# Altium footprint library UltraZOhm_CarrierBoard.PcbLib: 71 footprints (part 1 of 5)
Each footprint in its own frame and in the unit in brackets; x right, y up, seen from the top. Pads: shape width x height; smd on the part's side, far side on the other; paste and mask are expansions set on the pad; w line width, h text height; cw(c..) or ccw(c..) is an arc to the next point about the centre after c.
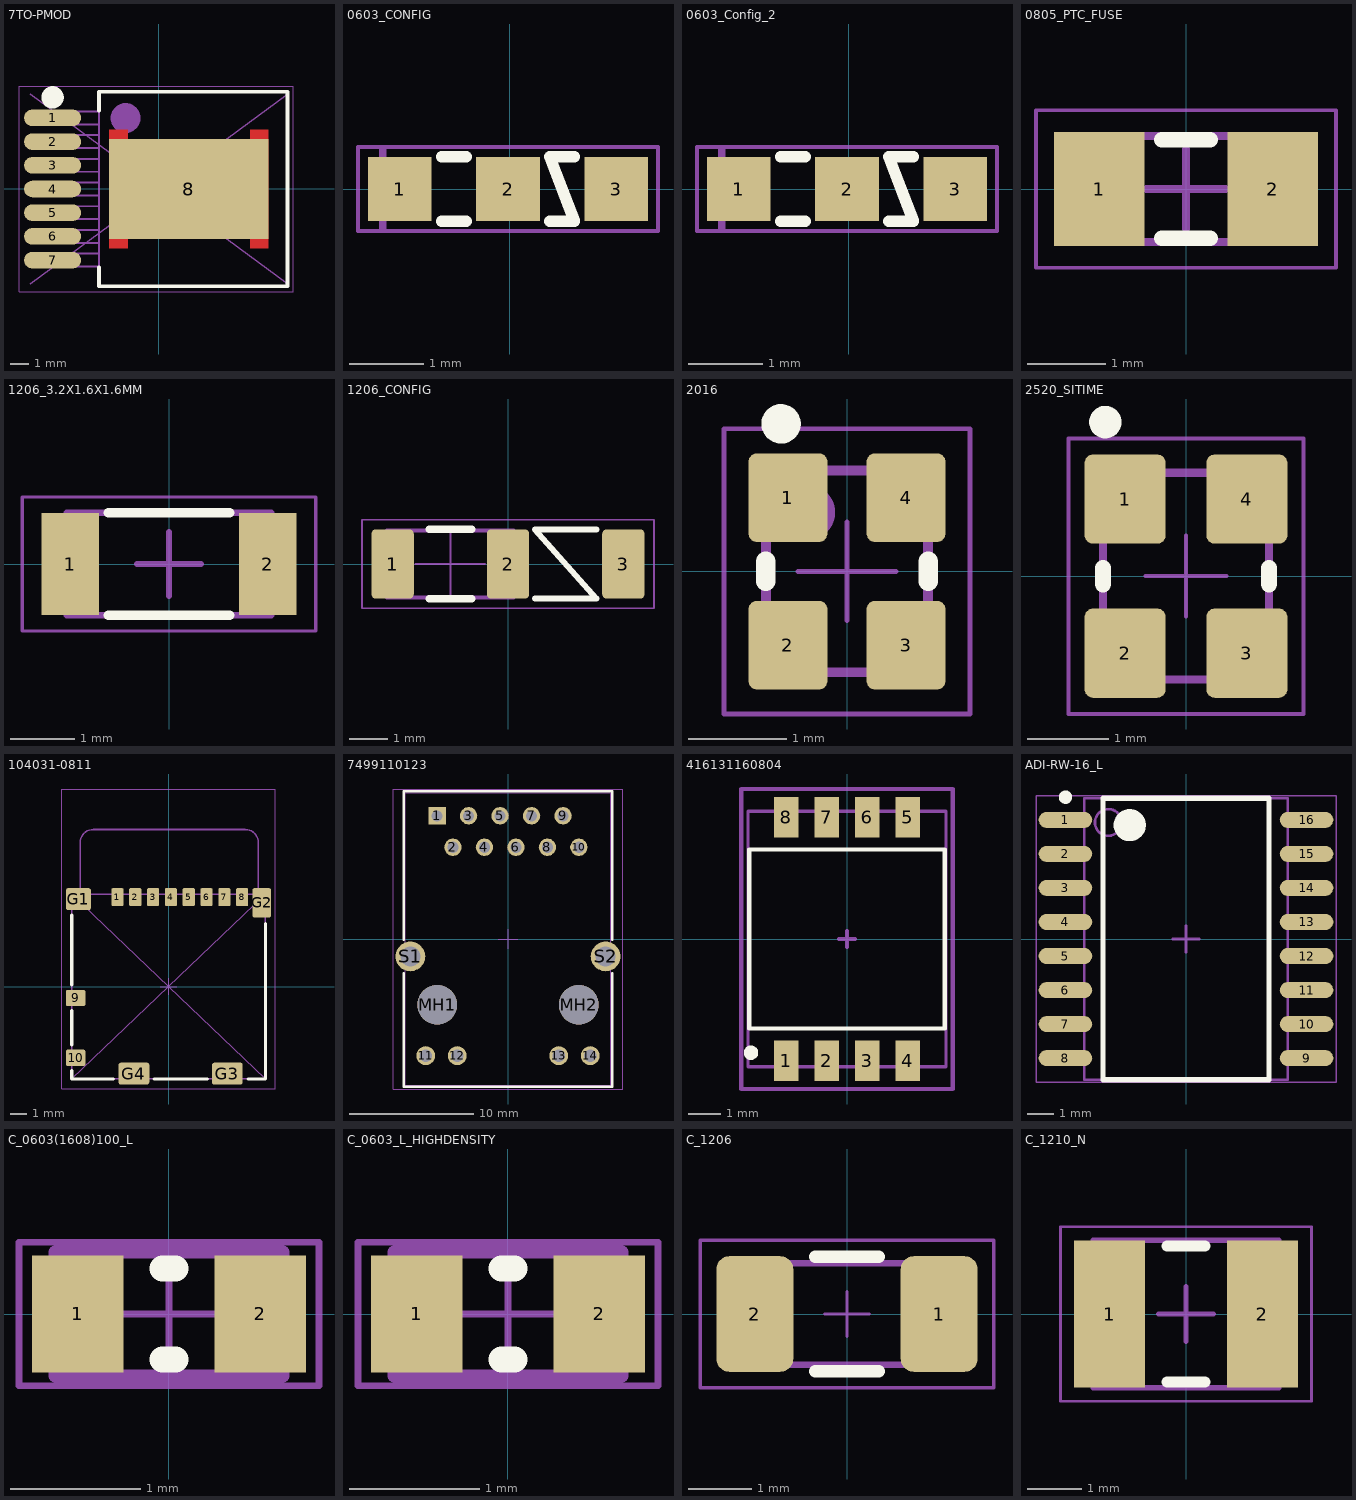
[diagram p0: the footprints below, top view; thin cyan lines are the x and y axes]

## 7TO-PMOD [mm]
pads (8):
  oval 3.06x0.89 smd: 1(-5.7,3.81) 2(-5.7,2.54) 3(-5.7,1.27) 4(-5.7,0) 5(-5.7,-1.27) 6(-5.7,-2.54) 7(-5.7,-3.81)
  rect 8.54x5.35 smd: 8(1.605,0)
Top Layer:
  region: 5.875,-3.2 5.875,3.2 4.875,3.2 4.875,-3.2
  region: -2.665,3.2 -2.665,-3.2 -1.665,-3.2 -1.665,3.2
Top Overlay:
  circle w0.6: c-5.7,4.91 r0.3
  lines w0.2: -3.215,-4.205 -3.215,-5.205 6.885,-5.205 6.885,5.205 -3.215,5.205 -3.215,4.205
Mechanical 5:
  circle w0.8: c-1.79,3.8 r0.4
  lines w0.1: -6.89,-4.155 -3.215,-4.155 ; -6.89,-3.465 -3.215,-3.465 ; -6.89,-2.885 -3.215,-2.885 ; -6.89,-2.195 -3.215,-2.195 ; -6.89,-1.615 -3.215,-1.615 ; -6.89,-0.925 -3.215,-0.925 ; -6.89,-0.345 -3.215,-0.345 ; -6.89,0.345 -3.215,0.345 ; -6.89,0.925 -3.215,0.925 ; -6.89,1.615 -3.215,1.615 ; -6.89,2.195 -3.215,2.195 ; -6.89,2.885 -3.215,2.885 ; -6.89,3.465 -3.215,3.465 ; -6.89,4.155 -3.215,4.155 ; -6.885,-4.155 -6.885,-3.465 ; -6.885,-2.885 -6.885,-2.195 ; -6.885,-1.615 -6.885,-0.925 ; -6.885,-0.345 -6.885,0.345 ; -6.885,0.925 -6.885,1.615 ; -6.885,2.195 -6.885,2.885 ; -6.885,3.465 -6.885,4.155 ; -4.79,-4.155 -4.79,-3.465 ; -4.79,-2.885 -4.79,-2.195 ; -4.79,-1.615 -4.79,-0.925 ; -4.79,-0.345 -4.79,0.345 ; -4.79,0.93 -4.79,1.615 ; -4.79,2.205 -4.79,2.885 ; -4.79,3.465 -4.79,4.155 ; -3.215,-5.205 -3.215,5.205 6.885,5.205 6.885,-5.205 -3.215,-5.205
  text ".Designator" at 1.437,1.658 h1.52
Mechanical 15:
  lines w0.05: -0.5,0 0.5,0 ; 0,-0.5 0,0.5 ; -7.5,-5.5 -7.5,5.5 7.2,5.5 7.2,-5.5 -7.5,-5.5
  lines w0.1: -6.885,-5.08 6.885,5.08 ; -6.885,5.08 6.885,-5.08
3D body: height 4.8, standoff 0, extent -2.138,2.275 -0.142,4.267
3D body "NDW0007A.stp": height 4.77, standoff 0, extent -6.885,-5.08 6.885,5.08

## 0603_CONFIG [mm]
pads (3):
  rect 0.85x0.85 smd: 1(-1.475,0) 2(-0.025,0) 3(1.425,0)
Top Overlay:
  lines w0.152: -0.914,-0.432 -0.584,-0.432 ; -0.914,0.432 -0.584,0.432 ; 0.533,-0.432 0.864,-0.432 0.533,0.432 0.864,0.432
Mechanical 5:
  lines w0.054: -2.032,-0.559 -2.032,0.559 1.981,0.559 1.981,-0.559 -2.032,-0.559
  lines w0.102: -1.7,-0.525 -1.7,0.525
  text ".Designator" at 1.795,0.417 h0.76
3D body: height 2.8, standoff -2.8, extent -1.537,-1.143 -1.537,-1.143
3D body "User Library-RESC1608X___.STEP": height 0.3, standoff 0, extent -1.55,-0.4 0.05,0.4

## 0603_Config_2 [mm]
pads (3):
  rect 0.85x0.85 smd: 1(-1.475,0) 2(-0.025,0) 3(1.425,0)
Top Overlay:
  lines w0.152: -0.914,-0.432 -0.584,-0.432 ; -0.914,0.432 -0.584,0.432 ; 0.533,-0.432 0.864,-0.432 0.533,0.432 0.864,0.432
Mechanical 5:
  lines w0.054: -2.032,-0.559 -2.032,0.559 1.981,0.559 1.981,-0.559 -2.032,-0.559
  lines w0.102: -1.7,-0.525 -1.7,0.525
  text ".Designator" at -1.4,-0.4 h0.76
3D body: height 2.8, standoff -2.8, extent -1.537,-1.143 -1.537,-1.143
3D body "User Library-RESC1608X___.STEP": height 0.3, standoff 0, extent -1.55,-0.4 0.05,0.4

## 0805_PTC_FUSE [mm]
pads (2):
  rect 1.15x1.45 smd: 1(-1.1,0) 2(1.1,0)
Top Overlay:
  lines w0.2: -0.304,-0.625 0.304,-0.625 ; -0.304,0.625 0.304,0.625
Mechanical 5:
  lines w0.1: -1.05,-0.675 -1.05,0.675 1.05,0.675 1.05,-0.675 -1.05,-0.675
  text ".Designator" at -1.5,0.9 h0.64
Mechanical 15:
  lines w0.05: -1.905,1 1.902,1 1.902,-1 ; -1.902,1 -1.902,-1 1.905,-1
  lines w0.1: -0.5,0 0.5,0 ; 0,-0.5 0,0.5
3D body: height 0.6, standoff 0, extent -0.7,-0.675 0.7,0.675
3D body: height 0.6, standoff 0, extent -1.05,-0.675 -0.7,0.675
3D body: height 0.6, standoff 0, extent 0.7,-0.675 1.05,0.675

## 1206_3.2X1.6X1.6MM [mm]
pads (2):
  rect 0.9x1.6 smd: 1(-1.55,0) 2(1.55,0)
Top Overlay:
  lines w0.15: -0.95,-0.8 0.95,-0.8 ; -0.95,0.8 0.95,0.8
Mechanical 5:
  lines w0.1: -1.6,-0.8 1.6,-0.8 1.6,0.8 -1.6,0.8 -1.6,-0.8
  text ".Designator" at -1,-0.4 h0.76
Mechanical 15:
  lines w0.05: -2.3,-1.05 2.3,-1.05 2.3,1.05 -2.3,1.05 -2.3,-1.05
  lines w0.1: -0.5,0 0.5,0 ; 0,-0.5 0,0.5
3D body "3.2x1.6x1.6x0.6.stp": height 1.63, standoff 0.03, extent -1.6,-0.8 1.6,0.8

## 1206_CONFIG [mm]
pads (3):
  rrect20% 1.1x1.8 smd: 1(-3,0) 2(0,0) 3(3,0)
Top Overlay:
  lines w0.152: 0.7,-0.9 2.3,-0.9 0.7,0.9 2.3,0.9
  lines w0.2: -2.05,-0.9 -0.95,-0.9 ; -2.05,0.9 -0.95,0.9
Mechanical 5:
  lines w0.1: -2.6,-0.875 -2.6,0.875 ; -0.4,-0.875 -0.4,0.875 ; -3.15,-0.875 -3.15,0.875 0.15,0.875 0.15,-0.875 -1.5,-0.875 -3.15,-0.875
  text ".Designator" at -0.01,-1.145 h0.76
Mechanical 15:
  lines w0.05: -2.4,0 -1.5,0 ; -1.5,-0.9 -1.5,0 ; -1.5,0.9 -1.5,0 ; -0.6,0 -1.5,0 ; -3.8,-1.15 -3.8,1.15 3.8,1.15 3.8,-1.15 -1.5,-1.15 -3.8,-1.15
3D body: height 2.8, standoff -2.8, extent -1.537,1.357 -1.537,1.357
3D body "RESC3216X06N.STEP": height 0.55, standoff 0, extent -3.1,-0.8 0.1,0.8

## 2016 [mm]
pads (4):
  rrect20% 0.8x0.9 smd: 1(-0.6,0.75) 2(-0.6,-0.75) 3(0.6,-0.75) 4(0.6,0.75)
Top Overlay:
  circle w0.2: c-0.67,1.5 r0.1
  lines w0.2: -0.825,-0.1 -0.825,0.1 ; 0.825,-0.1 0.825,0.1
Mechanical 5:
  circle w0.28: c-0.4,0.6 r0.14
  lines w0.1: -0.825,-1.025 0.825,-1.025 0.825,1.025 ; -0.825,-1.025 -0.825,-1.025 ; -0.825,-1.025 -0.825,1.025 0.825,1.025 ; 0.825,1.025 0.825,1.025
  text ".Designator" at 0.401,-0.601 h0.51
Mechanical 15:
  lines w0.05: -0.5,0 0.5,0 ; 0,-0.5 0,0.5 ; -1.25,-1.45 -1.25,1.45 1.25,1.45 1.25,-1.45 -1.25,-1.45
3D body: height 0.8, standoff 0, extent -0.825,-1.025 0.825,1.025
3D body: height 0.81, standoff 0, extent -0.6,0.4 -0.2,0.8

## 2520_SITIME [mm]
pads (4):
  rrect20% 1x1.1 smd: 1(-0.75,0.95) 2(-0.75,-0.95) 3(0.75,-0.95) 4(0.75,0.95)
Top Overlay:
  circle w0.2: c-0.995,1.9 r0.1
  lines w0.2: -1.025,-0.1 -1.025,0.1 ; 1.025,-0.1 1.025,0.1
Mechanical 5:
  circle w0.28: c-0.575,0.875 r0.14
  lines w0.1: -1.025,-1.275 -1.025,1.275 1.025,1.275 1.025,-1.275 -1.025,-1.275 ; -0.825,-1.025 -0.825,-1.025 ; 0.825,1.025 0.825,1.025
  text ".Designator" at 0.588,0.257 h0.76
Mechanical 15:
  lines w0.05: -0.5,0 0.5,0 ; 0,-0.5 0,0.5 ; -1.45,-1.7 1.45,-1.7 1.45,1.7 -1.45,1.7 -1.45,-1.7
3D body: height 0.81, standoff 0, extent -0.6,0.4 -0.2,0.798
3D body: height 0.8, standoff 0, extent -0.825,-1.025 0.825,1.025

## 104031-0811 [mm]
pads (14):
  rrect20% 0.75x1.1 smd: 1(-3.155,5.525) 2(-2.055,5.525) 3(-0.955,5.525) 4(0.145,5.525) 5(1.245,5.525) 6(2.345,5.525) 7(3.445,5.525) 8(4.545,5.525)
  rrect20% 1.2x1 smd: 9(-5.74,-0.7) 10(-5.74,-4.4)
  rrect20% 1.55x1.35 smd: G1(-5.565,5.4)
  rrect20% 1.17x1.8 smd: G2(5.755,5.175)
  rrect20% 1.9x1.35 smd: G3(3.63,-5.375) G4(-2.14,-5.375)
Top Overlay:
  lines w0.2: -5.975,-5.2 -5.975,-5.705 -3.4,-5.705 ; -5.975,-3.6 -5.975,-1.5 ; -5.975,0.1 -5.975,4.4 ; -0.9,-5.7 2.4,-5.7 ; 4.9,-5.7 5.98,-5.7 5.98,3.9
Mechanical 5:
  lines w0.1: -5.565,5.7 0,5.7 ; -5.455,5.7 -5.455,8.9 ; 5.545,5.7 5.545,8.9 ccw(c4.745,8.9) 4.745,9.7 -4.655,9.7 ; -5.455,8.9 cw(c-4.655,8.9) -4.655,9.7 ; -5.455,8.9 cw(c-4.655,8.9) -4.655,9.7 ; -5.975,-5.7 -5.975,5.7 5.975,5.7 5.975,-5.7 -5.975,-5.7
  text ".Designator" at -0.662,1.769 h1.52
Mechanical 15:
  lines w0.05: -5.975,-5.7 5.975,5.7 ; -5.975,5.7 5.975,-5.7 ; -0.5,0 0.5,0 ; -0.1,5.7 0.1,5.7 ; 0,-0.5 0,0.5 ; 0,5.6 0,5.8 ; -6.6,-6.3 6.6,-6.3 6.6,12.2 -6.6,12.2 -6.6,-6.3
3D body "1040310811.stp": height 1.43, standoff -0.02, extent -5.975,-5.7 5.975,5.7
3D body "SW3dPS-Micro_SD.STEP": height 1.45, standoff 0.47, extent -5.5,-5.3 5.5,9.7

## 7499110123 [mm]
pads (18):
  rect 1.4x1.4 hole 0.89: 1(-5.715,9.94)
  round 1.4 hole 0.89: 2(-4.445,7.4) 3(-3.175,9.94) 4(-1.905,7.4) 5(-0.635,9.94) 6(0.635,7.4) 7(1.905,9.94) 8(3.175,7.4) 9(4.445,9.94) 10(5.715,7.4)
  round 1.52 hole 1.02: 11(-6.635,-9.41) 12(-4.095,-9.41) 13(4.095,-9.41) 14(6.635,-9.41)
  round 3.2 hole 3.2 unplated: MH1(-5.715,-5.3) MH2(5.715,-5.3)
  round 2.4 hole 1.63: S1(-7.875,-1.41) S2(7.875,-1.41)
Top Overlay:
  lines w0.2: -8.4,-2.77 -8.4,-11.9 8.4,-11.9 8.4,-2.77 ; -8.4,-0.05 -8.4,11.9 8.4,11.9 8.4,-0.05
Mechanical 5:
  lines w0.1: -8.3,-11.8 -8.3,11.8 8.3,11.8 8.3,-11.8 -8.3,-11.8
  text ".Designator" at -1.3,-0.8 h1.52
Mechanical 11:
  lines w0.1: -8.3,-11.8 8.3,-11.8 8.3,11.8 -8.3,11.8 -8.3,-11.8
Mechanical 15:
  lines w0.1: -0.8,0 0.8,0 ; 0,-0.8 0,0.8 ; -9.275,-12.1 -9.275,12.1 9.275,12.1 9.275,-12.1 -9.275,-12.1
3D body "7499110123.stp": height 17.2, standoff -2.7, extent -8.3,-11.8 8.3,11.8

## 416131160804 [mm]
pads (8):
  rect 0.76x1.27 smd: 1(-1.905,-3.81) 2(-0.635,-3.81) 3(0.635,-3.81) 4(1.905,-3.81) 5(1.905,3.81) 6(0.635,3.81) 7(-0.635,3.81) 8(-1.905,3.81)
Top Overlay:
  circle w0.25: c-3.005,-3.56 r0.1
  lines w0.127: -3.06,-2.8 -3.06,2.8 3.06,2.8 3.06,-2.8 -3.06,-2.8
Mechanical 5:
  lines w0.1: -3.1,-4 3.1,-4 3.1,4 -3.1,4 -3.1,-4
  text ".Designator" at -0.7,-0.4 h0.76
Mechanical 15:
  lines w0.127: -0.254,0 0.254,0 ; 0,-0.254 0,0.254 ; -3.31,-4.695 -3.31,4.695 3.31,4.695 3.31,-4.695 -3.31,-4.695
3D body "416131160804.stp": height 2.06, standoff -0.04, extent -3.06,-4 3.06,4

## ADI-RW-16_L [mm]
pads (16):
  oval 2x0.6 smd: 1(-4.5,4.445) 2(-4.5,3.175) 3(-4.5,1.905) 4(-4.5,0.635) 5(-4.5,-0.635) 6(-4.5,-1.905) 7(-4.5,-3.175) 8(-4.5,-4.445) 9(4.5,-4.445) 10(4.5,-3.175) 11(4.5,-1.905) 12(4.5,-0.635) 13(4.5,0.635) 14(4.5,1.905) 15(4.5,3.175) 16(4.5,4.445)
Top Overlay:
  circle w0.25: c-4.5,5.295 r0.125
  circle w0.6: c-2.1,4.25 r0.3
  lines w0.2: -3.1,-5.25 -3.1,5.25 3.1,5.25 3.1,-5.25 -3.1,-5.25
Mechanical 5:
  circle w0.1: c-2.9,4.35 r0.5
  lines w0.1: -3.8,-5.25 -3.8,5.25 3.8,5.25 3.8,-5.25 -3.8,-5.25
  text ".Designator" at 0.833,-2.195 h1.52
Mechanical 15:
  lines w0.05: -5.6,-5.35 -5.6,5.35 5.6,5.35 5.6,-5.35 -5.6,-5.35
  lines w0.1: -0.5,0 0.5,0 ; 0,-0.5 0,0.5
3D body: height 2.65, standoff 0.1, extent -3.8,-5.25 3.8,5.25

## C_0603(1608)100_L [mm]
pads (2):
  rect 0.7x0.9 smd: 1(-0.7,0) 2(0.7,0)
Top Overlay:
  lines w0.2: -0.05,-0.35 0.05,-0.35 ; -0.05,0.35 0.05,0.35
Mechanical 5:
  lines w0.1: -0.875,-0.475 0.875,-0.475 0.875,0.475 -0.875,0.475 -0.875,-0.475
  text ".Designator" at 1.15,-0.225 h0.51
Mechanical 15:
  lines w0.05: -0.475,0 0.475,0 ; 0,-0.475 0,0.475 ; -1.15,-0.55 1.15,-0.55 1.15,0.55 -1.15,0.55 -1.15,-0.55
3D body: height 1, standoff 0, extent 0.525,-0.475 0.875,0.475
3D body: height 1, standoff 0, extent -0.875,-0.475 -0.525,0.475
3D body: height 1, standoff 0, extent -0.525,-0.475 0.525,0.475

## C_0603_L_HIGHDENSITY [mm]
pads (2):
  rect 0.7x0.9 smd: 1(-0.7,0) 2(0.7,0)
Top Overlay:
  lines w0.2: -0.05,-0.35 0.05,-0.35 ; -0.05,0.35 0.05,0.35
Mechanical 5:
  lines w0.1: -0.875,-0.475 0.875,-0.475 0.875,0.475 -0.875,0.475 -0.875,-0.475
  text ".Designator" at 0.636,0.208 h0.51
Mechanical 15:
  lines w0.05: -0.475,0 0.475,0 ; 0,-0.475 0,0.475 ; -1.15,-0.55 1.15,-0.55 1.15,0.55 -1.15,0.55 -1.15,-0.55
3D body: height 1, standoff 0, extent 0.525,-0.475 0.875,0.475
3D body: height 1, standoff 0, extent -0.875,-0.475 -0.525,0.475
3D body: height 1, standoff 0, extent -0.525,-0.475 0.525,0.475

## C_1206 [mm]
pads (2):
  rrect33% 1.21x1.82 smd: 1(1.45,0) 2(-1.45,0)
Top Overlay:
  lines w0.2: -0.5,-0.9 0.5,-0.9 ; -0.5,0.9 0.5,0.9
Mechanical 5:
  lines w0.1: -1.1,-0.8 -1.1,0.8 ; 1.1,-0.8 1.1,0.8 ; -1.6,-0.8 1.6,-0.8 1.6,0.8 -1.6,0.8 -1.6,-0.8
  text ".Designator" at 1.895,0.552 h0.76
Mechanical 15:
  lines w0.05: -0.35,0 0.35,0 ; 0,-0.35 0,0.35 ; -2.31,-1.16 2.31,-1.16 2.31,1.16 -2.31,1.16 -2.31,-1.16
3D body "User Library-CAPC3216X___CAPC3216X180N.STEP": height 1.82, standoff 0, extent -1.6,-0.81 1.6,0.81

## C_1210_N [mm]
pads (2):
  rect 1.3x2.7 smd: 1(-1.4,0) 2(1.4,0)
Top Overlay:
  lines w0.2: -0.35,-1.25 0.35,-1.25 ; -0.35,1.25 0.35,1.25
Mechanical 5:
  lines w0.1: -1.7,-1.35 1.7,-1.35 1.7,1.35 -1.7,1.35 -1.7,-1.35
  text ".Designator" at -0.409,0.949 h0.76
Mechanical 15:
  lines w0.05: -2.3,-1.6 2.3,-1.6 2.3,1.6 -2.3,1.6 -2.3,-1.6
  lines w0.1: -0.5,0 0.5,0 ; 0,-0.5 0,0.5
3D body: height 2.8, standoff 0, extent 1.2,-1.35 1.7,1.35
3D body: height 2.8, standoff 0, extent -1.7,-1.35 -1.2,1.35
3D body: height 2.8, standoff 0, extent -1.2,-1.35 1.2,1.35